# Altium footprint library 13-IC Packages-1bga1.PcbLib: 72 footprints (part 5 of 6)
Each footprint in its own frame and in the unit in brackets; x right, y up, seen from the top. Pads: shape width x height; smd on the part's side, far side on the other; paste and mask are expansions set on the pad; w line width, h text height; cw(c..) or ccw(c..) is an arc to the next point about the centre after c.
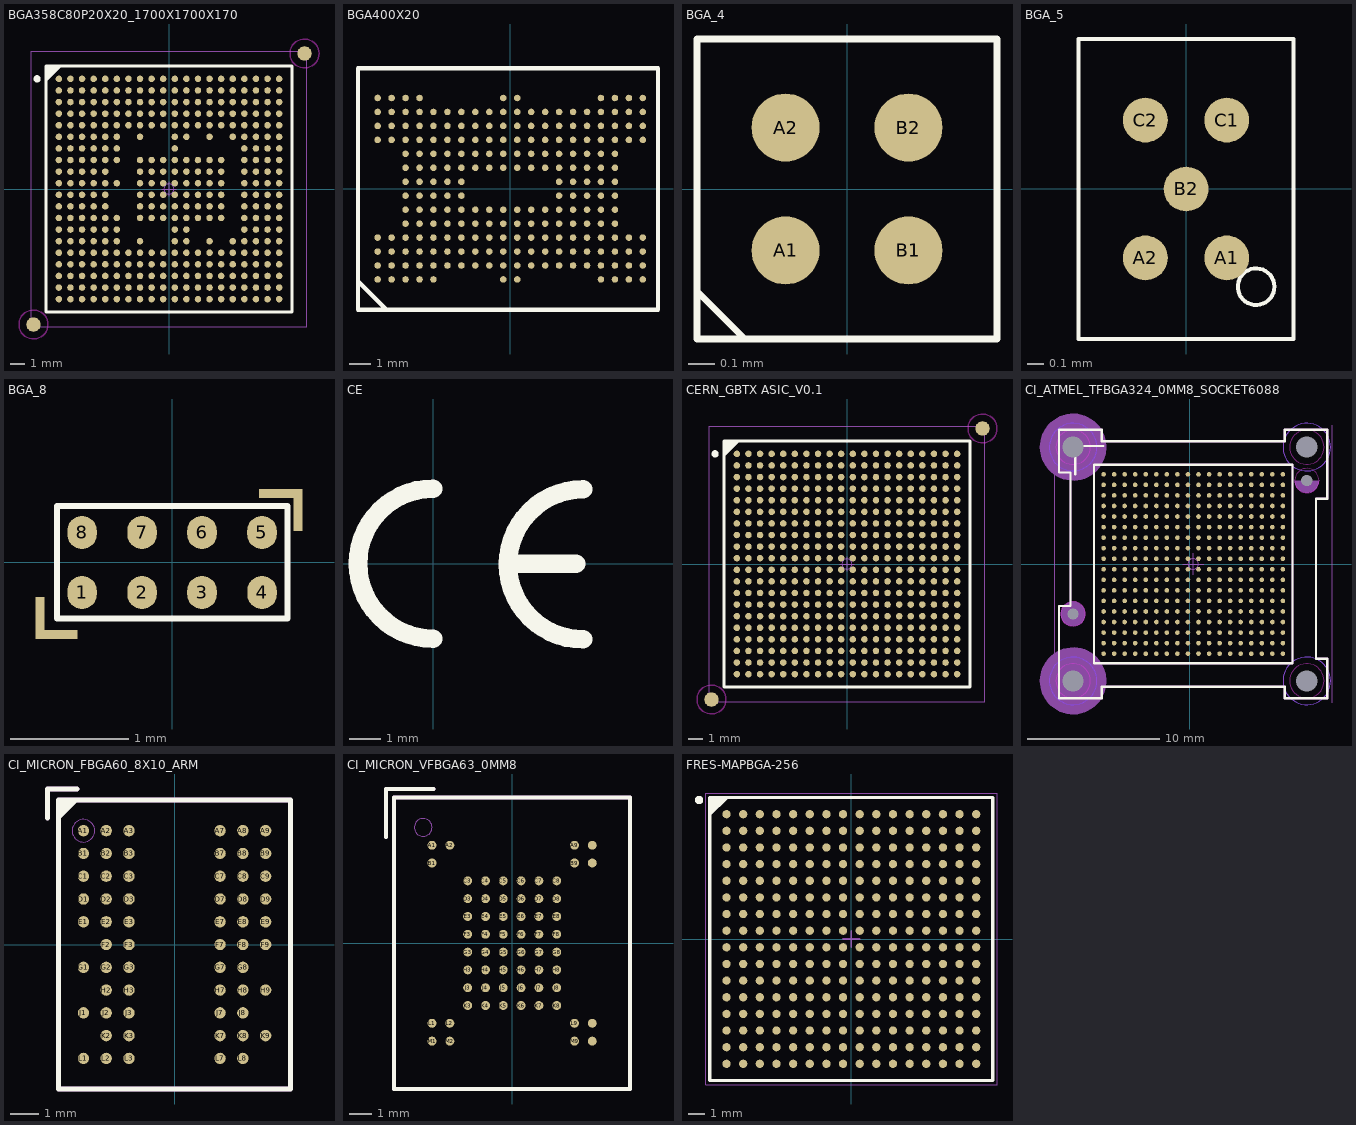
[diagram p4: the footprints below, top view; thin cyan lines are the x and y axes]

## BGA358C80P20X20_1700X1700X170 [mm] "BGA, 0.80mm Pitch, Square; 358 Pin, 20 Columns X 20 Rows, 17.00mm X 17.00mm X 1.70mm H"
height 1.7
pads (360):
  round 0.45 smd: A1(-7.6,7.6) A2(-6.8,7.6) A3(-6,7.6) A4(-5.2,7.6) A5(-4.4,7.6) A6(-3.6,7.6) A7(-2.8,7.6) A8(-2,7.6) A9(-1.2,7.6) A10(-0.4,7.6) A11(0.4,7.6) A12(1.2,7.6) A13(2,7.6) A14(2.8,7.6) A15(3.6,7.6) A16(4.4,7.6) A17(5.2,7.6) A18(6,7.6) A19(6.8,7.6) A20(7.6,7.6) B1(-7.6,6.8) B2(-6.8,6.8) B3(-6,6.8) B4(-5.2,6.8) B5(-4.4,6.8) B6(-3.6,6.8) B7(-2.8,6.8) B8(-2,6.8) B9(-1.2,6.8) B10(-0.4,6.8) B11(0.4,6.8) B12(1.2,6.8) B13(2,6.8) B14(2.8,6.8) B15(3.6,6.8) B16(4.4,6.8) B17(5.2,6.8) B18(6,6.8) B19(6.8,6.8) B20(7.6,6.8) C1(-7.6,6) C2(-6.8,6) C3(-6,6) C4(-5.2,6) C5(-4.4,6) C6(-3.6,6) C7(-2.8,6) C8(-2,6) C9(-1.2,6) C10(-0.4,6) C11(0.4,6) C12(1.2,6) C13(2,6) C14(2.8,6) C15(3.6,6) C16(4.4,6) C17(5.2,6) C18(6,6) C19(6.8,6) C20(7.6,6) D1(-7.6,5.2) D2(-6.8,5.2) D3(-6,5.2) D4(-5.2,5.2) D5(-4.4,5.2) D6(-3.6,5.2) D7(-2.8,5.2) D8(-2,5.2) D9(-1.2,5.2) D10(-0.4,5.2) D11(0.4,5.2) D12(1.2,5.2) D13(2,5.2) D14(2.8,5.2) D15(3.6,5.2) D16(4.4,5.2) D17(5.2,5.2) D18(6,5.2) D19(6.8,5.2) D20(7.6,5.2) E1(-7.6,4.4) E2(-6.8,4.4) E3(-6,4.4) E4(-5.2,4.4) E5(-4.4,4.4) E6(-3.6,4.4) E7(-2.8,4.4) E8(-2,4.4) E9(-1.2,4.4) E10(-0.4,4.4) E11(0.4,4.4) E12(1.2,4.4) E13(2,4.4) E14(2.8,4.4) E15(3.6,4.4) E16(4.4,4.4) E17(5.2,4.4) E18(6,4.4) E19(6.8,4.4) E20(7.6,4.4) F1(-7.6,3.6) F2(-6.8,3.6) F3(-6,3.6) F4(-5.2,3.6) F5(-4.4,3.6) F6(-3.6,3.6) F8(-2,3.6) F11(0.4,3.6) F12(1.2,3.6) F14(2.8,3.6) F16(4.4,3.6) F17(5.2,3.6) F18(6,3.6) F19(6.8,3.6) F20(7.6,3.6) G1(-7.6,2.8) G2(-6.8,2.8) G3(-6,2.8) G4(-5.2,2.8) G5(-4.4,2.8) G6(-3.6,2.8) G11(0.4,2.8) G17(5.2,2.8) G18(6,2.8) G19(6.8,2.8) G20(7.6,2.8) H1(-7.6,2) H2(-6.8,2) H3(-6,2) H4(-5.2,2) H5(-4.4,2) H6(-3.6,2) H8(-2,2) H9(-1.2,2) H10(-0.4,2) H11(0.4,2) H12(1.2,2) H13(2,2) H14(2.8,2) H15(3.6,2) H17(5.2,2) H18(6,2) H19(6.8,2) H20(7.6,2) J1(-7.6,1.2) J2(-6.8,1.2) J3(-6,1.2) J4(-5.2,1.2) J5(-4.4,1.2) J8(-2,1.2) J9(-1.2,1.2) J10(-0.4,1.2) J11(0.4,1.2) J12(1.2,1.2) J13(2,1.2) J14(2.8,1.2) J15(3.6,1.2) J17(5.2,1.2) J18(6,1.2) J19(6.8,1.2) J20(7.6,1.2) K1(-7.6,0.4) K2(-6.8,0.4) K3(-6,0.4) K4(-5.2,0.4) K5(-4.4,0.4) K6(-3.6,0.4) K8(-2,0.4) K9(-1.2,0.4) K10(-0.4,0.4) K11(0.4,0.4) K12(1.2,0.4) K13(2,0.4) K14(2.8,0.4) K15(3.6,0.4) K17(5.2,0.4) K18(6,0.4) K19(6.8,0.4) K20(7.6,0.4) L1(-7.6,-0.4) L2(-6.8,-0.4) L3(-6,-0.4) L4(-5.2,-0.4) L5(-4.4,-0.4) L8(-2,-0.4) L9(-1.2,-0.4) L10(-0.4,-0.4) L11(0.4,-0.4) L12(1.2,-0.4) L13(2,-0.4) L14(2.8,-0.4) L15(3.6,-0.4) L17(5.2,-0.4) L18(6,-0.4) L19(6.8,-0.4) L20(7.6,-0.4) M1(-7.6,-1.2) M2(-6.8,-1.2) M3(-6,-1.2) M4(-5.2,-1.2) M5(-4.4,-1.2) M8(-2,-1.2) M9(-1.2,-1.2) M10(-0.4,-1.2) M11(0.4,-1.2) M12(1.2,-1.2) M13(2,-1.2) M14(2.8,-1.2) M15(3.6,-1.2) M17(5.2,-1.2) M18(6,-1.2) M19(6.8,-1.2) M20(7.6,-1.2) N1(-7.6,-2) N2(-6.8,-2) N3(-6,-2) N4(-5.2,-2) N5(-4.4,-2) N6(-3.6,-2) N8(-2,-2) N9(-1.2,-2) N10(-0.4,-2) N11(0.4,-2) N12(1.2,-2) N13(2,-2) N14(2.8,-2) N15(3.6,-2) N17(5.2,-2) N18(6,-2) N19(6.8,-2) N20(7.6,-2) P1(-7.6,-2.8) P2(-6.8,-2.8) P3(-6,-2.8) P4(-5.2,-2.8) P5(-4.4,-2.8) P6(-3.6,-2.8) P11(0.4,-2.8) P12(1.2,-2.8) P17(5.2,-2.8) P18(6,-2.8) P19(6.8,-2.8) P20(7.6,-2.8) R1(-7.6,-3.6) R2(-6.8,-3.6) R3(-6,-3.6) R4(-5.2,-3.6) R5(-4.4,-3.6) R6(-3.6,-3.6) R8(-2,-3.6) R11(0.4,-3.6) R12(1.2,-3.6) R14(2.8,-3.6) R16(4.4,-3.6) R17(5.2,-3.6) R18(6,-3.6) R19(6.8,-3.6) R20(7.6,-3.6) T1(-7.6,-4.4) T2(-6.8,-4.4) T3(-6,-4.4) T4(-5.2,-4.4) T5(-4.4,-4.4) T6(-3.6,-4.4) T7(-2.8,-4.4) T8(-2,-4.4) T9(-1.2,-4.4) T10(-0.4,-4.4) T11(0.4,-4.4) T12(1.2,-4.4) T13(2,-4.4) T14(2.8,-4.4) T15(3.6,-4.4) T16(4.4,-4.4) T17(5.2,-4.4) T18(6,-4.4) T19(6.8,-4.4) T20(7.6,-4.4) U1(-7.6,-5.2) U2(-6.8,-5.2) U3(-6,-5.2) U4(-5.2,-5.2) U5(-4.4,-5.2) U6(-3.6,-5.2) U7(-2.8,-5.2) U8(-2,-5.2) U9(-1.2,-5.2) U10(-0.4,-5.2) U11(0.4,-5.2) U12(1.2,-5.2) U13(2,-5.2) U14(2.8,-5.2) U15(3.6,-5.2) U16(4.4,-5.2) U17(5.2,-5.2) U18(6,-5.2) U19(6.8,-5.2) U20(7.6,-5.2) V1(-7.6,-6) V2(-6.8,-6) V3(-6,-6) V4(-5.2,-6) V5(-4.4,-6) V6(-3.6,-6) V7(-2.8,-6) V8(-2,-6) V9(-1.2,-6) V10(-0.4,-6) V11(0.4,-6) V12(1.2,-6) V13(2,-6) V14(2.8,-6) V15(3.6,-6) V16(4.4,-6) V17(5.2,-6) V18(6,-6) V19(6.8,-6) V20(7.6,-6) W1(-7.6,-6.8) W2(-6.8,-6.8) W3(-6,-6.8) W4(-5.2,-6.8) W5(-4.4,-6.8) W6(-3.6,-6.8) W7(-2.8,-6.8) W8(-2,-6.8) W9(-1.2,-6.8) W10(-0.4,-6.8) W11(0.4,-6.8) W12(1.2,-6.8) W13(2,-6.8) W14(2.8,-6.8) W15(3.6,-6.8) W16(4.4,-6.8) W17(5.2,-6.8) W18(6,-6.8) W19(6.8,-6.8) W20(7.6,-6.8) Y1(-7.6,-7.6) Y2(-6.8,-7.6) Y3(-6,-7.6) Y4(-5.2,-7.6) Y5(-4.4,-7.6) Y6(-3.6,-7.6) Y7(-2.8,-7.6) Y8(-2,-7.6) Y9(-1.2,-7.6) Y10(-0.4,-7.6) Y11(0.4,-7.6) Y12(1.2,-7.6) Y13(2,-7.6) Y14(2.8,-7.6) Y15(3.6,-7.6) Y16(4.4,-7.6) Y17(5.2,-7.6) Y18(6,-7.6) Y19(6.8,-7.6) Y20(7.6,-7.6)
  round 1 smd paste-0.51 mask+0.5: FTG1(-9.35,-9.35) FTG2(9.35,9.35)
Top Layer keep-out:
  circle w0.1: c-9.35,-9.35 r1
  circle w0.1: c9.35,9.35 r1
Top Overlay:
  circle w0.25: c-9.1,7.6 r0.125
  lines w0.2: -8.5,7.5 -7.5,8.5 ; -8.5,7.7 -7.7,8.5 ; -8.5,7.9 -7.9,8.5 ; -8.5,8.1 -8.1,8.5 ; -8.5,8.3 -8.3,8.5 ; -8.5,-8.5 -8.5,8.5 8.5,8.5 8.5,-8.5 -8.5,-8.5
Mechanical 14:
  lines w0.1: -8.5,7.5 -7.5,8.5 ; -8.5,7.6 -7.6,8.5 ; -8.5,7.7 -7.7,8.5 ; -8.5,7.8 -7.8,8.5 ; -8.5,7.9 -7.9,8.5 ; -8.5,8 -8,8.5 ; -8.5,8.1 -8.1,8.5 ; -8.5,8.2 -8.2,8.5 ; -8.5,8.3 -8.3,8.5 ; -8.5,8.4 -8.4,8.5 ; -8.5,-8.5 -8.5,8.5 8.5,8.5 8.5,-8.5 -8.5,-8.5
  text "Y" at -9.4,-7.9 h0.6
  text "W" at -9.4,-7.1 h0.6
  text "V" at -9.4,-6.3 h0.6
  text "U" at -9.4,-5.5 h0.6
  text "T" at -9.4,-4.7 h0.6
  text "R" at -9.4,-3.9 h0.6
  text "P" at -9.4,-3.1 h0.6
  text "N" at -9.4,-2.3 h0.6
  text "M" at -9.4,-1.5 h0.6
  text "L" at -9.4,-0.7 h0.6
  text "K" at -9.4,0.1 h0.6
  text "J" at -9.4,0.9 h0.6
  text "H" at -9.4,1.7 h0.6
  text "G" at -9.4,2.5 h0.6
  text "F" at -9.4,3.3 h0.6
  text "E" at -9.4,4.1 h0.6
  text "D" at -9.4,4.9 h0.6
  text "C" at -9.4,5.7 h0.6
  text "B" at -9.4,6.5 h0.6
  text "A" at -9.4,7.3 h0.6
  text "1" at -7.35,8.9 h0.6
  text "2" at -6.55,8.9 h0.6
  text "3" at -5.75,8.9 h0.6
  text "4" at -4.95,8.9 h0.6
  text "5" at -4.15,8.9 h0.6
  text "6" at -3.35,8.9 h0.6
  text "7" at -2.55,8.9 h0.6
  text "8" at -1.75,8.9 h0.6
  text "9" at -0.95,8.9 h0.6
  text "10" at -0.15,8.9 h0.6
  text "11" at 0.65,8.9 h0.6
  text "12" at 1.45,8.9 h0.6
  text "13" at 2.25,8.9 h0.6
  text "14" at 3.05,8.9 h0.6
  text "15" at 3.85,8.9 h0.6
  text "16" at 4.65,8.9 h0.6
  text "17" at 5.45,8.9 h0.6
  text "18" at 6.25,8.9 h0.6
  text "19" at 7.05,8.9 h0.6
  text "20" at 7.85,8.9 h0.6
Mechanical 15:
  circle w0.05: c0,0 r0.35
  lines w0.05: -0.5,0 0.5,0 ; 0,-0.5 0,0.5 ; -9.5,-9.5 -9.5,9.5 9.5,9.5 9.5,-9.5 -9.5,-9.5
3D body "BGA358C80P20X20_1700X1700X170.stp": height 1.7, standoff 0, extent -8.5,-8.5 8.5,8.5

## BGA400X20 [mm]
height 23.14
pads (225):
  round 0.305 smd: A1(-6.175,-4.225) A2(-6.175,-3.575) A3(-6.175,-2.925) A4(-6.175,-2.275) A11(-6.175,2.275) A12(-6.175,2.925) A13(-6.175,3.575) A14(-6.175,4.225) B1(-5.525,-4.225) B2(-5.525,-3.575) B3(-5.525,-2.925) B4(-5.525,-2.275) B11(-5.525,2.275) B12(-5.525,2.925) B13(-5.525,3.575) B14(-5.525,4.225) C1(-4.875,-4.225) C2(-4.875,-3.575) C3(-4.875,-2.925) C4(-4.875,-2.275) C5(-4.875,-1.625) C7(-4.875,-0.325) C8(-4.875,0.325) C9(-4.875,0.975) C10(-4.875,1.625) C11(-4.875,2.275) C12(-4.875,2.925) C13(-4.875,3.575) C14(-4.875,4.225) D1(-4.225,-4.225) D2(-4.225,-3.575) D3(-4.225,-2.925) D4(-4.225,-2.275) D5(-4.225,-1.625) D6(-4.225,-0.975) D7(-4.225,-0.325) D8(-4.225,0.325) D9(-4.225,0.975) D10(-4.225,1.625) D11(-4.225,2.275) D12(-4.225,2.925) D13(-4.225,3.575) D14(-4.225,4.225) E1(-3.575,-4.225) E2(-3.575,-3.575) E3(-3.575,-2.925) E4(-3.575,-2.275) E5(-3.575,-1.625) E6(-3.575,-0.975) E7(-3.575,-0.325) E8(-3.575,0.325) E9(-3.575,0.975) E10(-3.575,1.625) E11(-3.575,2.275) E12(-3.575,2.925) E13(-3.575,3.575) F2(-2.925,-3.575) F3(-2.925,-2.925) F4(-2.925,-2.275) F5(-2.925,-1.625) F6(-2.925,-0.975) F8(-2.925,0.325) F9(-2.925,0.975) F10(-2.925,1.625) F11(-2.925,2.275) F12(-2.925,2.925) F13(-2.925,3.575) G3(-2.275,-2.925) G4(-2.275,-2.275) G5(-2.275,-1.625) G6(-2.275,-0.975) G7(-2.275,-0.325) G8(-2.275,0.325) G9(-2.275,0.975) G10(-2.275,1.625) G11(-2.275,2.275) G12(-2.275,2.925) H2(-1.625,-3.575) H3(-1.625,-2.925) H4(-1.625,-2.275) H5(-1.625,-1.625) H6(-1.625,-0.975) H9(-1.625,0.975) H10(-1.625,1.625) H11(-1.625,2.275) H12(-1.625,2.925) H13(-1.625,3.575) J2(-0.975,-3.575) J3(-0.975,-2.925) J4(-0.975,-2.275) J5(-0.975,-1.625) J6(-0.975,-0.975) J9(-0.975,0.975) J10(-0.975,1.625) J11(-0.975,2.275) J12(-0.975,2.925) J13(-0.975,3.575) K1(-0.325,-4.225) K2(-0.325,-3.575) K3(-0.325,-2.925) K4(-0.325,-2.275) K5(-0.325,-1.625) K6(-0.325,-0.975) K9(-0.325,0.975) K10(-0.325,1.625) K11(-0.325,2.275) K12(-0.325,2.925) K13(-0.325,3.575) K14(-0.325,4.225) L1(0.325,-4.225) L2(0.325,-3.575) L3(0.325,-2.925) L4(0.325,-2.275) L5(0.325,-1.625) L6(0.325,-0.975) L9(0.325,0.975) L10(0.325,1.625) L11(0.325,2.275) L12(0.325,2.925) L14(0.325,4.225) M2(0.975,-3.575) M3(0.975,-2.925) M4(0.975,-2.275) M5(0.975,-1.625) M6(0.975,-0.975) M9(0.975,0.975) M10(0.975,1.625) M11(0.975,2.275) M12(0.975,2.925) M13(0.975,3.575) N2(1.625,-3.575) N3(1.625,-2.925) N4(1.625,-2.275) N5(1.625,-1.625) N6(1.625,-0.975) N9(1.625,0.975) N10(1.625,1.625) N11(1.625,2.275) N12(1.625,2.925) N13(1.625,3.575) P3(2.275,-2.925) P4(2.275,-2.275) P5(2.275,-1.625) P6(2.275,-0.975) P7(2.275,-0.325) P8(2.275,0.325) P9(2.275,0.975) P10(2.275,1.625) P11(2.275,2.275) P12(2.275,2.925) R2(2.925,-3.575) R3(2.925,-2.925) R4(2.925,-2.275) R5(2.925,-1.625) R6(2.925,-0.975) R7(2.925,-0.325) R9(2.925,0.975) R10(2.925,1.625) R11(2.925,2.275) R12(2.925,2.925) R13(2.925,3.575) T2(3.575,-3.575) T3(3.575,-2.925) T4(3.575,-2.275) T5(3.575,-1.625) T6(3.575,-0.975) T7(3.575,-0.325) T8(3.575,0.325) T9(3.575,0.975) T10(3.575,1.625) T11(3.575,2.275) T12(3.575,2.925) T13(3.575,3.575) U1(4.225,-4.225) U3(4.225,-2.925) U4(4.225,-2.275) U5(4.225,-1.625) U7(4.225,-0.325) U8(4.225,0.325) U9(4.225,0.975) U11(4.225,2.275) U12(4.225,2.925) U14(4.225,4.225) V1(4.875,-4.225) V2(4.875,-3.575) V3(4.875,-2.925) V4(4.875,-2.275) V5(4.875,-1.625) V6(4.875,-0.975) V7(4.875,-0.325) V8(4.875,0.325) V9(4.875,0.975) V10(4.875,1.625) V11(4.875,2.275) V12(4.875,2.925) V13(4.875,3.575) V14(4.875,4.225) W1(5.525,-4.225) W2(5.525,-3.575) W3(5.525,-2.925) W4(5.525,-2.275) W11(5.525,2.275) W12(5.525,2.925) W13(5.525,3.575) W14(5.525,4.225) Y1(6.175,-4.225) Y2(6.175,-3.575) Y3(6.175,-2.925) Y4(6.175,-2.275) Y11(6.175,2.275) Y12(6.175,2.925) Y13(6.175,3.575) Y14(6.175,4.225)
  round 0.305 smd mask+0: C6(-4.875,-0.975) F7(-2.925,-0.325) G2(-2.275,-3.575) G13(-2.275,3.575) L13(0.325,3.575) P2(2.275,-3.575) P13(2.275,3.575) R8(2.925,0.325) U2(4.225,-3.575) U6(4.225,-0.975) U10(4.225,1.625) U13(4.225,3.575)
Top Overlay:
  lines w0.203: -7.064,-4.327 -5.759,-5.632 ; -7.089,-5.639 6.881,-5.639 6.881,5.613 -7.089,5.613 -7.089,-5.639
3D body "bga800x20.stp": height 0.78, standoff 0, extent -6.894,-5.45 6.706,5.45

## BGA_4 [mil]
height 911.02
pads (4):
  round 10 smd mask+2: A1(-9.02,-9.02) A2(-9.02,9.02) B1(9.02,-9.02) B2(9.02,9.02)
Top Overlay:
  lines w0.98: -22,-15 -15,-22
  lines w1: -22.01,-22.01 22.01,-22.01 22.01,22.01 -22.01,22.01 -22.01,-22.01

## BGA_5 [mil]
height 911.02
pads (5):
  round 11 smd mask+2: A1(10,-16.93) A2(-10,-16.93) B2(0,0) C1(10,16.93) C2(-10,16.93)
Top Overlay:
  circle w1: c17.2,-24 r4.5
  lines w1: -26.44,-36.85 -26.44,36.85 26.41,36.85 26.41,-36.85 -26.44,-36.85

## BGA_8 [mm]
height 23.14
pads (12):
  oval 0.25x0.28 smd mask+0.051: 1(-0.764,-0.255) 2(-0.256,-0.255) 3(0.252,-0.255) 4(0.76,-0.255) 5(0.76,0.253) 6(0.252,0.253) 7(-0.256,0.253) 8(-0.764,0.253)
  rect 0.076x0.356 smd mask+0.051: ""(-1.12,-0.471) ""(1.065,0.444)
  rect 0.356x0.076 smd mask+0.051: ""(-0.981,-0.611) ""(0.912,0.583)
Top Overlay:
  lines w0.051: -0.975,-0.475 0.975,-0.475 0.975,0.475 -0.975,0.475 -0.975,-0.475

## CE [mm]
Top Overlay:
  lines w0.6: 0,-2.413 cw(c0,0) 0,2.413 ; 2.53,0 4.6,0 ; 4.826,-2.438 cw(c4.826,-0.025) 4.826,2.388
3D body "ce.stp": height 0.02, standoff 0, extent -2.725,-2.725 4.82,2.725

## CERN_GBTX ASIC_V0.1 [mm] "BGA, 0.80mm Pitch, Square; 400 Pin, 20 Columns X 20 Rows, 17.00mm X 17.00mm X 3.56mm H"
height 3.56
pads (402):
  round 0.45 smd: A1(-7.6,7.6) A2(-6.8,7.6) A3(-6,7.6) A4(-5.2,7.6) A5(-4.4,7.6) A6(-3.6,7.6) A7(-2.8,7.6) A8(-2,7.6) A9(-1.2,7.6) A10(-0.4,7.6) A11(0.4,7.6) A12(1.2,7.6) A13(2,7.6) A14(2.8,7.6) A15(3.6,7.6) A16(4.4,7.6) A17(5.2,7.6) A18(6,7.6) A19(6.8,7.6) A20(7.6,7.6) B1(-7.6,6.8) B2(-6.8,6.8) B3(-6,6.8) B4(-5.2,6.8) B5(-4.4,6.8) B6(-3.6,6.8) B7(-2.8,6.8) B8(-2,6.8) B9(-1.2,6.8) B10(-0.4,6.8) B11(0.4,6.8) B12(1.2,6.8) B13(2,6.8) B14(2.8,6.8) B15(3.6,6.8) B16(4.4,6.8) B17(5.2,6.8) B18(6,6.8) B19(6.8,6.8) B20(7.6,6.8) C1(-7.6,6) C2(-6.8,6) C3(-6,6) C4(-5.2,6) C5(-4.4,6) C6(-3.6,6) C7(-2.8,6) C8(-2,6) C9(-1.2,6) C10(-0.4,6) C11(0.4,6) C12(1.2,6) C13(2,6) C14(2.8,6) C15(3.6,6) C16(4.4,6) C17(5.2,6) C18(6,6) C19(6.8,6) C20(7.6,6) D1(-7.6,5.2) D2(-6.8,5.2) D3(-6,5.2) D4(-5.2,5.2) D5(-4.4,5.2) D6(-3.6,5.2) D7(-2.8,5.2) D8(-2,5.2) D9(-1.2,5.2) D10(-0.4,5.2) D11(0.4,5.2) D12(1.2,5.2) D13(2,5.2) D14(2.8,5.2) D15(3.6,5.2) D16(4.4,5.2) D17(5.2,5.2) D18(6,5.2) D19(6.8,5.2) D20(7.6,5.2) E1(-7.6,4.4) E2(-6.8,4.4) E3(-6,4.4) E4(-5.2,4.4) E5(-4.4,4.4) E6(-3.6,4.4) E7(-2.8,4.4) E8(-2,4.4) E9(-1.2,4.4) E10(-0.4,4.4) E11(0.4,4.4) E12(1.2,4.4) E13(2,4.4) E14(2.8,4.4) E15(3.6,4.4) E16(4.4,4.4) E17(5.2,4.4) E18(6,4.4) E19(6.8,4.4) E20(7.6,4.4) F1(-7.6,3.6) F2(-6.8,3.6) F3(-6,3.6) F4(-5.2,3.6) F5(-4.4,3.6) F6(-3.6,3.6) F7(-2.8,3.6) F8(-2,3.6) F9(-1.2,3.6) F10(-0.4,3.6) F11(0.4,3.6) F12(1.2,3.6) F13(2,3.6) F14(2.8,3.6) F15(3.6,3.6) F16(4.4,3.6) F17(5.2,3.6) F18(6,3.6) F19(6.8,3.6) F20(7.6,3.6) G1(-7.6,2.8) G2(-6.8,2.8) G3(-6,2.8) G4(-5.2,2.8) G5(-4.4,2.8) G6(-3.6,2.8) G7(-2.8,2.8) G8(-2,2.8) G9(-1.2,2.8) G10(-0.4,2.8) G11(0.4,2.8) G12(1.2,2.8) G13(2,2.8) G14(2.8,2.8) G15(3.6,2.8) G16(4.4,2.8) G17(5.2,2.8) G18(6,2.8) G19(6.8,2.8) G20(7.6,2.8) H1(-7.6,2) H2(-6.8,2) H3(-6,2) H4(-5.2,2) H5(-4.4,2) H6(-3.6,2) H7(-2.8,2) H8(-2,2) H9(-1.2,2) H10(-0.4,2) H11(0.4,2) H12(1.2,2) H13(2,2) H14(2.8,2) H15(3.6,2) H16(4.4,2) H17(5.2,2) H18(6,2) H19(6.8,2) H20(7.6,2) J1(-7.6,1.2) J2(-6.8,1.2) J3(-6,1.2) J4(-5.2,1.2) J5(-4.4,1.2) J6(-3.6,1.2) J7(-2.8,1.2) J8(-2,1.2) J9(-1.2,1.2) J10(-0.4,1.2) J11(0.4,1.2) J12(1.2,1.2) J13(2,1.2) J14(2.8,1.2) J15(3.6,1.2) J16(4.4,1.2) J17(5.2,1.2) J18(6,1.2) J19(6.8,1.2) J20(7.6,1.2) K1(-7.6,0.4) K2(-6.8,0.4) K3(-6,0.4) K4(-5.2,0.4) K5(-4.4,0.4) K6(-3.6,0.4) K7(-2.8,0.4) K8(-2,0.4) K9(-1.2,0.4) K10(-0.4,0.4) K11(0.4,0.4) K12(1.2,0.4) K13(2,0.4) K14(2.8,0.4) K15(3.6,0.4) K16(4.4,0.4) K17(5.2,0.4) K18(6,0.4) K19(6.8,0.4) K20(7.6,0.4) L1(-7.6,-0.4) L2(-6.8,-0.4) L3(-6,-0.4) L4(-5.2,-0.4) L5(-4.4,-0.4) L6(-3.6,-0.4) L7(-2.8,-0.4) L8(-2,-0.4) L9(-1.2,-0.4) L10(-0.4,-0.4) L11(0.4,-0.4) L12(1.2,-0.4) L13(2,-0.4) L14(2.8,-0.4) L15(3.6,-0.4) L16(4.4,-0.4) L17(5.2,-0.4) L18(6,-0.4) L19(6.8,-0.4) L20(7.6,-0.4) M1(-7.6,-1.2) M2(-6.8,-1.2) M3(-6,-1.2) M4(-5.2,-1.2) M5(-4.4,-1.2) M6(-3.6,-1.2) M7(-2.8,-1.2) M8(-2,-1.2) M9(-1.2,-1.2) M10(-0.4,-1.2) M11(0.4,-1.2) M12(1.2,-1.2) M13(2,-1.2) M14(2.8,-1.2) M15(3.6,-1.2) M16(4.4,-1.2) M17(5.2,-1.2) M18(6,-1.2) M19(6.8,-1.2) M20(7.6,-1.2) N1(-7.6,-2) N2(-6.8,-2) N3(-6,-2) N4(-5.2,-2) N5(-4.4,-2) N6(-3.6,-2) N7(-2.8,-2) N8(-2,-2) N9(-1.2,-2) N10(-0.4,-2) N11(0.4,-2) N12(1.2,-2) N13(2,-2) N14(2.8,-2) N15(3.6,-2) N16(4.4,-2) N17(5.2,-2) N18(6,-2) N19(6.8,-2) N20(7.6,-2) P1(-7.6,-2.8) P2(-6.8,-2.8) P3(-6,-2.8) P4(-5.2,-2.8) P5(-4.4,-2.8) P6(-3.6,-2.8) P7(-2.8,-2.8) P8(-2,-2.8) P9(-1.2,-2.8) P10(-0.4,-2.8) P11(0.4,-2.8) P12(1.2,-2.8) P13(2,-2.8) P14(2.8,-2.8) P15(3.6,-2.8) P16(4.4,-2.8) P17(5.2,-2.8) P18(6,-2.8) P19(6.8,-2.8) P20(7.6,-2.8) R1(-7.6,-3.6) R2(-6.8,-3.6) R3(-6,-3.6) R4(-5.2,-3.6) R5(-4.4,-3.6) R6(-3.6,-3.6) R7(-2.8,-3.6) R8(-2,-3.6) R9(-1.2,-3.6) R10(-0.4,-3.6) R11(0.4,-3.6) R12(1.2,-3.6) R13(2,-3.6) R14(2.8,-3.6) R15(3.6,-3.6) R16(4.4,-3.6) R17(5.2,-3.6) R18(6,-3.6) R19(6.8,-3.6) R20(7.6,-3.6) T1(-7.6,-4.4) T2(-6.8,-4.4) T3(-6,-4.4) T4(-5.2,-4.4) T5(-4.4,-4.4) T6(-3.6,-4.4) T7(-2.8,-4.4) T8(-2,-4.4) T9(-1.2,-4.4) T10(-0.4,-4.4) T11(0.4,-4.4) T12(1.2,-4.4) T13(2,-4.4) T14(2.8,-4.4) T15(3.6,-4.4) T16(4.4,-4.4) T17(5.2,-4.4) T18(6,-4.4) T19(6.8,-4.4) T20(7.6,-4.4) U1(-7.6,-5.2) U2(-6.8,-5.2) U3(-6,-5.2) U4(-5.2,-5.2) U5(-4.4,-5.2) U6(-3.6,-5.2) U7(-2.8,-5.2) U8(-2,-5.2) U9(-1.2,-5.2) U10(-0.4,-5.2) U11(0.4,-5.2) U12(1.2,-5.2) U13(2,-5.2) U14(2.8,-5.2) U15(3.6,-5.2) U16(4.4,-5.2) U17(5.2,-5.2) U18(6,-5.2) U19(6.8,-5.2) U20(7.6,-5.2) V1(-7.6,-6) V2(-6.8,-6) V3(-6,-6) V4(-5.2,-6) V5(-4.4,-6) V6(-3.6,-6) V7(-2.8,-6) V8(-2,-6) V9(-1.2,-6) V10(-0.4,-6) V11(0.4,-6) V12(1.2,-6) V13(2,-6) V14(2.8,-6) V15(3.6,-6) V16(4.4,-6) V17(5.2,-6) V18(6,-6) V19(6.8,-6) V20(7.6,-6) W1(-7.6,-6.8) W2(-6.8,-6.8) W3(-6,-6.8) W4(-5.2,-6.8) W5(-4.4,-6.8) W6(-3.6,-6.8) W7(-2.8,-6.8) W8(-2,-6.8) W9(-1.2,-6.8) W10(-0.4,-6.8) W11(0.4,-6.8) W12(1.2,-6.8) W13(2,-6.8) W14(2.8,-6.8) W15(3.6,-6.8) W16(4.4,-6.8) W17(5.2,-6.8) W18(6,-6.8) W19(6.8,-6.8) W20(7.6,-6.8) Y1(-7.6,-7.6) Y2(-6.8,-7.6) Y3(-6,-7.6) Y4(-5.2,-7.6) Y5(-4.4,-7.6) Y6(-3.6,-7.6) Y7(-2.8,-7.6) Y8(-2,-7.6) Y9(-1.2,-7.6) Y10(-0.4,-7.6) Y11(0.4,-7.6) Y12(1.2,-7.6) Y13(2,-7.6) Y14(2.8,-7.6) Y15(3.6,-7.6) Y16(4.4,-7.6) Y17(5.2,-7.6) Y18(6,-7.6) Y19(6.8,-7.6) Y20(7.6,-7.6)
  round 1 smd paste-0.51 mask+0.5: FTG1(-9.35,-9.35) FTG2(9.35,9.35)
Top Layer keep-out:
  circle w0.1: c-9.35,-9.35 r1
  circle w0.1: c9.35,9.35 r1
Top Overlay:
  circle w0.25: c-9.1,7.6 r0.125
  lines w0.2: -8.5,7.5 -7.5,8.5 ; -8.5,7.7 -7.7,8.5 ; -8.5,7.9 -7.9,8.5 ; -8.5,8.1 -8.1,8.5 ; -8.5,8.3 -8.3,8.5 ; -8.5,-8.5 -8.5,8.5 8.5,8.5 8.5,-8.5 -8.5,-8.5
Mechanical 14:
  lines w0.1: -8.5,7.5 -7.5,8.5 ; -8.5,7.6 -7.6,8.5 ; -8.5,7.7 -7.7,8.5 ; -8.5,7.8 -7.8,8.5 ; -8.5,7.9 -7.9,8.5 ; -8.5,8 -8,8.5 ; -8.5,8.1 -8.1,8.5 ; -8.5,8.2 -8.2,8.5 ; -8.5,8.3 -8.3,8.5 ; -8.5,8.4 -8.4,8.5 ; -8.5,-8.5 -8.5,8.5 8.5,8.5 8.5,-8.5 -8.5,-8.5
Mechanical 15:
  circle w0.05: c0,0 r0.35
  lines w0.05: -0.5,0 0.5,0 ; 0,-0.5 0,0.5 ; -9.5,-9.5 -9.5,9.5 9.5,9.5 9.5,-9.5 -9.5,-9.5
3D body "CERN_GBTX ASIC_V0.1.stp": height 3.56, standoff 0, extent -8.5,-8.5 8.5,8.5

## CI_ATMEL_TFBGA324_0MM8_SOCKET6088 [mm]
height 25.75
pads (330):
  round 1 / inner round 1.61 / far side round 1 hole 1.61: " "(-8.863,-8.863) " "(-8.863,8.863) " "(8.863,-8.863) " "(8.863,8.863)
  round 0.5 / inner round 0.85 / far side round 0.5 hole 0.85: " "(-8.863,-3.783) " "(8.862,6.323)
  round 0.35 smd: A1(-6.553,6.8) A2(-5.753,6.8) A3(-4.953,6.8) A4(-4.152,6.8) A5(-3.353,6.8) A6(-2.553,6.8) A7(-1.752,6.8) A8(-0.953,6.8) A9(-0.153,6.8) A10(0.647,6.8) A11(1.448,6.8) A12(2.247,6.8) A13(3.047,6.8) A14(3.848,6.8) A15(4.647,6.8) A16(5.447,6.8) A17(6.247,6.8) A18(7.048,6.8) B1(-6.553,6) B2(-5.753,6) B3(-4.953,6) B4(-4.152,6) B5(-3.352,6) B6(-2.553,6) B7(-1.753,6) B8(-0.953,6) B9(-0.153,6) B10(0.647,6) B11(1.448,6) B12(2.248,6) B13(3.047,6) B14(3.847,6) B15(4.647,6) B16(5.447,6) B17(6.248,6) B18(7.048,6) C1(-6.553,5.2) C2(-5.753,5.2) C3(-4.953,5.2) C4(-4.152,5.2) C5(-3.352,5.2) C6(-2.553,5.2) C7(-1.753,5.2) C8(-0.953,5.2) C9(-0.153,5.2) C10(0.647,5.2) C11(1.448,5.2) C12(2.248,5.2) C13(3.047,5.2) C14(3.847,5.2) C15(4.647,5.2) C16(5.447,5.2) C17(6.247,5.2) C18(7.048,5.2) D1(-6.553,4.4) D2(-5.753,4.4) D3(-4.953,4.4) D4(-4.152,4.4) D5(-3.353,4.4) D6(-2.553,4.4) D7(-1.752,4.4) D8(-0.953,4.4) D9(-0.153,4.4) D10(0.647,4.4) D11(1.448,4.4) D12(2.247,4.4) D13(3.047,4.4) D14(3.848,4.4) D15(4.647,4.4) D16(5.447,4.4) D17(6.248,4.4) D18(7.048,4.4) E1(-6.552,3.6) E2(-5.753,3.6) E3(-4.953,3.6) E4(-4.153,3.6) E5(-3.353,3.6) E6(-2.553,3.6) E7(-1.752,3.6) E8(-0.952,3.6) E9(-0.153,3.6) E10(0.647,3.6) E11(1.447,3.6) E12(2.247,3.6) E13(3.047,3.6) E14(3.848,3.6) E15(4.648,3.6) E16(5.447,3.6) E17(6.247,3.6) E18(7.047,3.6) F1(-6.552,2.8) F2(-5.752,2.8) F3(-4.953,2.8) F4(-4.153,2.8) F5(-3.353,2.8) F6(-2.553,2.8) F7(-1.752,2.8) F8(-0.952,2.8) F9(-0.152,2.8) F10(0.647,2.8) F11(1.447,2.8) F12(2.247,2.8) F13(3.047,2.8) F14(3.848,2.8) F15(4.648,2.8) F16(5.448,2.8) F17(6.247,2.8) F18(7.047,2.8) G1(-6.552,2) G2(-5.753,2) G3(-4.953,2) G4(-4.153,2) G5(-3.353,2) G6(-2.553,2) G7(-1.752,2) G8(-0.952,2) G9(-0.153,2) G10(0.647,2) G11(1.447,2) G12(2.247,2) G13(3.047,2) G14(3.848,2) G15(4.648,2) G16(5.447,2) G17(6.247,2) G18(7.047,2) H1(-6.553,1.2) H2(-5.753,1.2) H3(-4.953,1.2) H4(-4.152,1.2) H5(-3.353,1.2) H6(-2.553,1.2) H7(-1.752,1.2) H8(-0.953,1.2) H9(-0.153,1.2) H10(0.647,1.2) H11(1.448,1.2) H12(2.247,1.2) H13(3.047,1.2) H14(3.848,1.2) H15(4.647,1.2) H16(5.447,1.2) H17(6.247,1.2) H18(7.048,1.2) J1(-6.553,0.4) J2(-5.753,0.4) J3(-4.953,0.4) J4(-4.152,0.4) J5(-3.352,0.4) J6(-2.553,0.4) J7(-1.753,0.4) J8(-0.953,0.4) J9(-0.153,0.4) J10(0.647,0.4) J11(1.448,0.4) J12(2.248,0.4) J13(3.047,0.4) J14(3.847,0.4) J15(4.647,0.4) J16(5.447,0.4) J17(6.247,0.4) J18(7.048,0.4) K1(-6.553,-0.4) K2(-5.753,-0.4) K3(-4.953,-0.4) K4(-4.152,-0.4) K5(-3.352,-0.4) K6(-2.553,-0.4) K7(-1.753,-0.4) K8(-0.953,-0.4) K9(-0.153,-0.4) K10(0.647,-0.4) K11(1.448,-0.4) K12(2.248,-0.4) K13(3.047,-0.4) K14(3.847,-0.4) K15(4.647,-0.4) K16(5.447,-0.4) K17(6.248,-0.4) K18(7.048,-0.4) L1(-6.553,-1.2) L2(-5.753,-1.2) L3(-4.953,-1.2) L4(-4.152,-1.2) L5(-3.353,-1.2) L6(-2.553,-1.2) L7(-1.752,-1.2) L8(-0.953,-1.2) L9(-0.153,-1.2) L10(0.647,-1.2) L11(1.448,-1.2) L12(2.247,-1.2) L13(3.047,-1.2) L14(3.848,-1.2) L15(4.647,-1.2) L16(5.447,-1.2) L17(6.247,-1.2) L18(7.048,-1.2) M1(-6.552,-2) M2(-5.753,-2) M3(-4.953,-2) M4(-4.153,-2) M5(-3.353,-2) M6(-2.553,-2) M7(-1.752,-2) M8(-0.952,-2) M9(-0.153,-2) M10(0.647,-2) M11(1.447,-2) M12(2.247,-2) M13(3.047,-2) M14(3.848,-2) M15(4.648,-2) M16(5.447,-2) M17(6.248,-2) M18(7.047,-2) N1(-6.552,-2.8) N2(-5.752,-2.8) N3(-4.953,-2.8) N4(-4.153,-2.8) N5(-3.353,-2.8) N6(-2.553,-2.8) N7(-1.752,-2.8) N8(-0.952,-2.8) N9(-0.152,-2.8) N10(0.647,-2.8) N11(1.447,-2.8) N12(2.247,-2.8) N13(3.047,-2.8) N14(3.848,-2.8) N15(4.648,-2.8) N16(5.448,-2.8) N17(6.247,-2.8) N18(7.047,-2.8) P1(-6.552,-3.6) P2(-5.753,-3.6) P3(-4.953,-3.6) P4(-4.153,-3.6) P5(-3.353,-3.6) P6(-2.553,-3.6) P7(-1.752,-3.6) P8(-0.952,-3.6) P9(-0.153,-3.6) P10(0.647,-3.6) P11(1.447,-3.6) P12(2.247,-3.6) P13(3.047,-3.6) P14(3.848,-3.6) P15(4.648,-3.6) P16(5.447,-3.6) P17(6.247,-3.6) P18(7.047,-3.6) R1(-6.553,-4.4) R2(-5.753,-4.4) R3(-4.953,-4.4) R4(-4.152,-4.4) R5(-3.353,-4.4) R6(-2.553,-4.4) R7(-1.752,-4.4) R8(-0.953,-4.4) R9(-0.153,-4.4) R10(0.647,-4.4) R11(1.448,-4.4) R12(2.247,-4.4) R13(3.047,-4.4) R14(3.848,-4.4) R15(4.647,-4.4) R16(5.447,-4.4) R17(6.247,-4.4) R18(7.048,-4.4) T1(-6.553,-5.2) T2(-5.753,-5.2) T3(-4.953,-5.2) T4(-4.152,-5.2) T5(-3.352,-5.2) T6(-2.553,-5.2) T7(-1.753,-5.2) T8(-0.953,-5.2) T9(-0.153,-5.2) T10(0.647,-5.2) T11(1.448,-5.2) T12(2.248,-5.2) T13(3.047,-5.2) T14(3.847,-5.2) T15(4.647,-5.2) T16(5.447,-5.2) T17(6.247,-5.2) T18(7.048,-5.2) U1(-6.553,-6) U2(-5.753,-6) U3(-4.953,-6) U4(-4.152,-6) U5(-3.352,-6) U6(-2.553,-6) U7(-1.753,-6) U8(-0.953,-6) U9(-0.153,-6) U10(0.647,-6) U11(1.448,-6) U12(2.248,-6) U13(3.047,-6) U14(3.847,-6) U15(4.647,-6) U16(5.447,-6) U17(6.247,-6) U18(7.048,-6) V1(-6.553,-6.8) V2(-5.753,-6.8) V3(-4.953,-6.8) V4(-4.152,-6.8) V5(-3.353,-6.8) V6(-2.553,-6.8) V7(-1.752,-6.8) V8(-0.953,-6.8) V9(-0.153,-6.8) V10(0.647,-6.8) V11(1.448,-6.8) V12(2.247,-6.8) V13(3.047,-6.8) V14(3.848,-6.8) V15(4.647,-6.8) V16(5.447,-6.8) V17(6.247,-6.8) V18(7.048,-6.8)